# Altium footprint library misc.PcbLib: 60 footprints (part 2 of 4)
Each footprint in its own frame and in the unit in brackets; x right, y up, seen from the top. Pads: shape width x height; smd on the part's side, far side on the other; paste and mask are expansions set on the pad; w line width, h text height; cw(c..) or ccw(c..) is an arc to the next point about the centre after c.
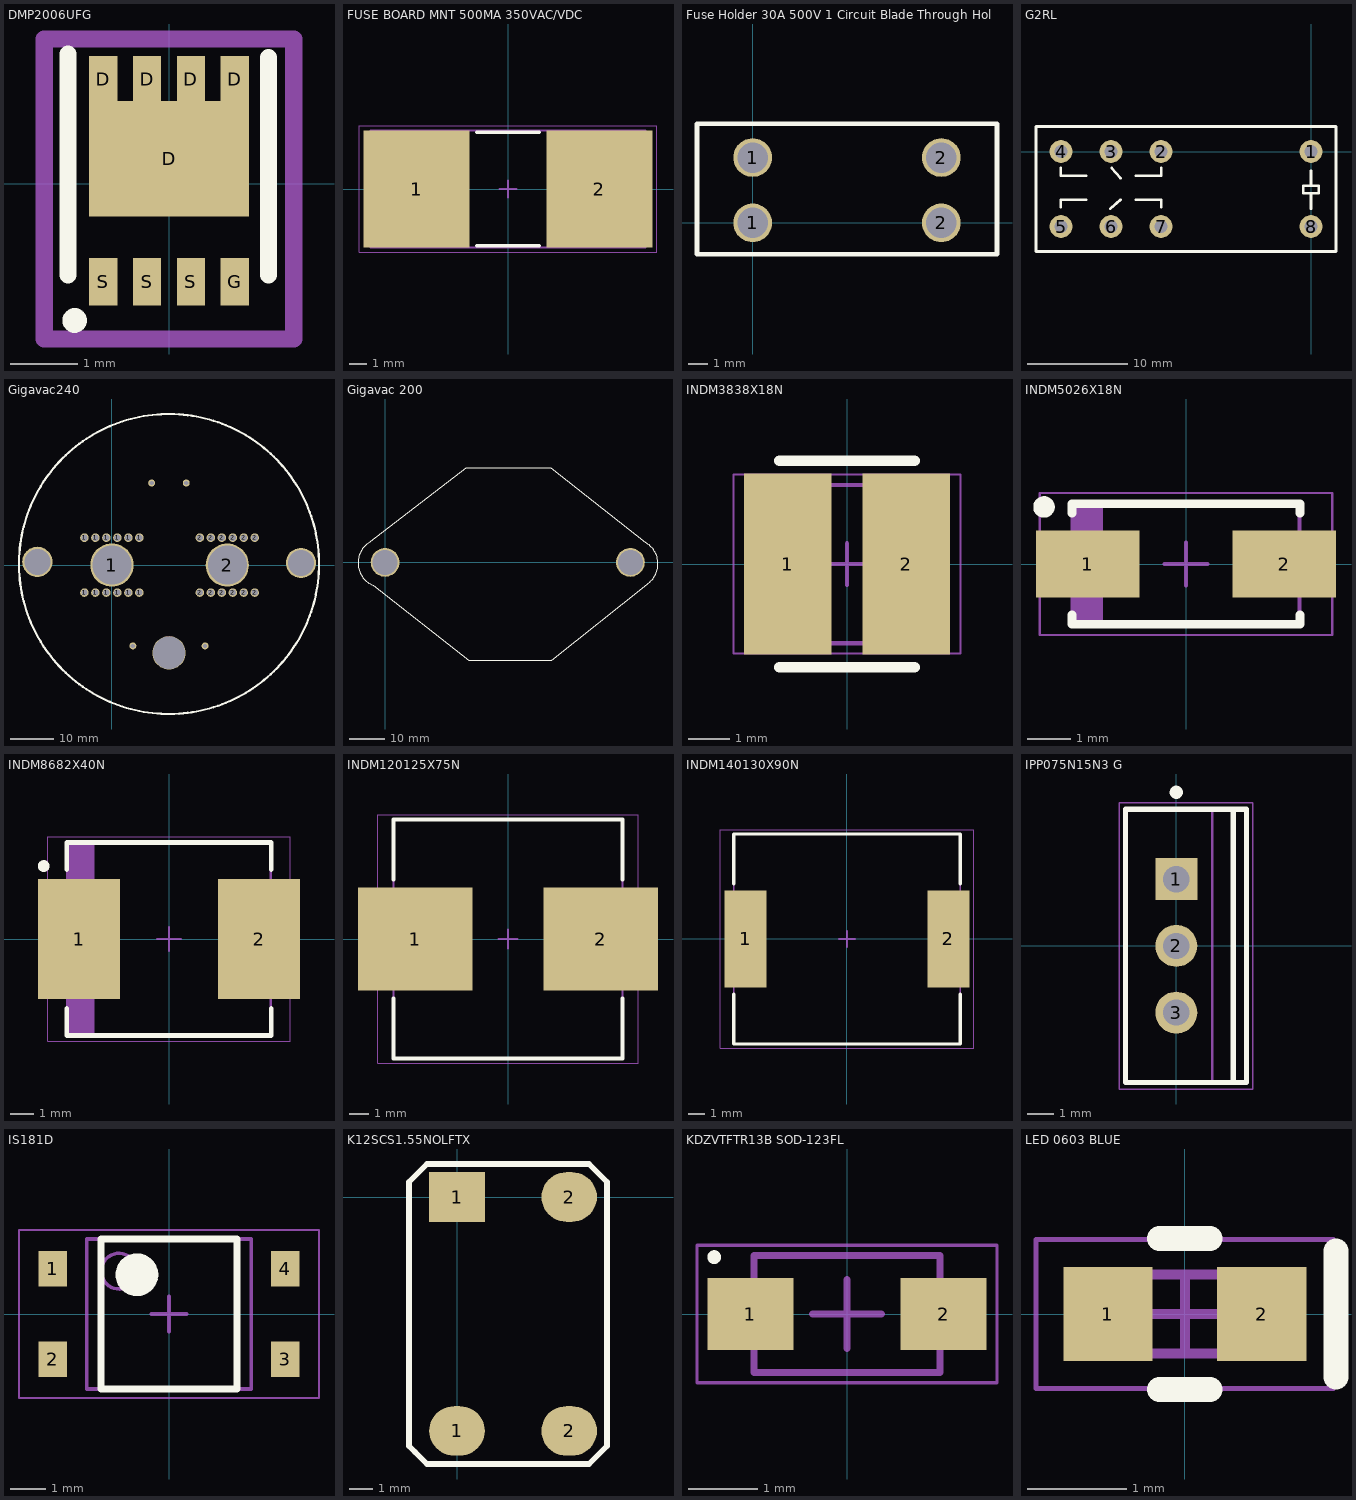
[diagram p1: the footprints below, top view; thin cyan lines are the x and y axes]

## DMP2006UFG [mm]
pads (9):
  rect 0.42x0.7 smd: D(-0.975,1.55) D(-0.325,1.55) D(0.325,1.55) D(0.975,1.55) G(0.975,-1.45) S(-0.975,-1.45) S(-0.325,-1.45) S(0.325,-1.45)
  rect 2.37x1.71 smd: D(0,0.375)
Top Overlay:
  circle w0.254: c-1.4,-2.025 r0.056
  lines w0.254: -1.5,-1.35 -1.5,1.925 ; 1.475,-1.35 1.475,1.875
Top Courtyard:
  lines w0.254: -1.85,-2.3 1.85,-2.3 1.85,2.15 -1.85,2.15 -1.85,-2.3
3D body: height 0.25, standoff 0, extent -1.65,-1.65 1.65,1.65

## FUSE BOARD MNT 500MA 350VAC/VDC [mm]
height 4.25
pads (2):
  rect 6.1x6.75 smd: 1(-5.25,0) 2(5.25,0)
Top Overlay:
  lines w0.2: -1.8,-3.275 1.8,-3.275 ; -1.8,3.275 1.8,3.275
Mechanical 13:
  lines w0.1: -7.925,-3.365 -7.925,3.365 7.925,3.365 7.925,-3.365 -7.925,-3.365
Mechanical 15:
  lines w0.05: -8.55,-3.65 -8.55,3.65 8.55,3.65 8.55,-3.65 -8.55,-3.65
  lines w0.1: -0.5,0 0.5,0 ; 0,-0.5 0,0.5
3D body: height 4.25, standoff 0, extent -2.295,-3.365 2.295,3.365
3D body: height 4.25, standoff 0, extent -7.925,-3.365 -2.295,3.365
3D body: height 4.25, standoff 0, extent 2.295,-3.365 7.925,3.365

## Fuse Holder 30A 500V 1 Circuit Blade Through Hole [mil]
pads (4):
  round 80 hole 63: 1(0,0) 1(0,135) 2(390,0) 2(390,135)
Top Overlay:
  lines w10: -115,-65 -115,37.5 -115,102.5 -115,205 505,205 505,147.5 505,61.25 505,2.5 505,-65 200,-65 -115,-65
3D body: height 290, standoff 20, extent -110,-60 505,200

## G2RL [mm]
height 15.5
pads (8):
  round 2.3 hole 1.3: 1(0,0) 2(-15,0) 3(-20,0) 4(-25,0) 5(-25,-7.5) 6(-20,-7.5) 7(-15,-7.5) 8(0,-7.5)
Top Overlay:
  lines w0.254: -25.019,-5.588 -25.019,-4.826 -22.479,-4.826 ; -25.019,-1.651 -25.019,-2.413 -22.479,-2.413 ; -20.066,-5.715 -19.05,-4.826 ; -19.939,-1.651 -19.05,-2.667 ; -17.526,-4.826 -14.986,-4.826 -14.986,-5.588 ; -17.526,-2.413 -14.986,-2.413 -14.986,-1.651 ; 0,-5.715 0,-4.191 ; 0,-1.905 0,-3.429 ; 0,-4.191 0.762,-4.191 0.762,-3.429 0,-3.429 ; 0,-4.191 -0.762,-4.191 -0.762,-3.429 0,-3.429 ; -27.5,-10 -27.5,2.5 2.5,2.5 2.5,-10 -27.5,-10
3D body: height 15.7, standoff 0, extent -27.432,-9.906 2.413,2.413

## Gigavac240 [mm]
pads (33):
  round 1.975 / inner round 1.6 / far side round 1.975 hole 1.475: 1(-6.35,-6.35) 1(-6.35,6.35) 1(-3.81,-6.35) 1(-3.81,6.35) 1(-1.27,-6.35) 1(-1.27,6.35) 1(1.27,-6.35) 1(1.27,6.35) 1(3.81,-6.35) 1(3.81,6.35) 1(6.35,-6.35) 1(6.35,6.35) 2(20.35,-6.35) 2(20.35,6.35) 2(22.89,-6.35) 2(22.89,6.35) 2(25.43,-6.35) 2(25.43,6.35) 2(27.97,-6.35) 2(27.97,6.35) 2(30.51,-6.35) 2(30.51,6.35) 2(33.05,-6.35) 2(33.05,6.35)
  round 10 hole 9: 1(0,0) 2(26.7,0)
  round 1.6 hole 1: 3(4.85,-18.7) 4(21.55,-18.7) 5(9.2,19) 6(17.2,19)
  round 7 hole 6: ""(-17.25,0.762) ""(43.75,0.508)
  round 7.7 hole 7.5: ""(13.208,-20.3)
Top Overlay:
  circle w0.5: c13.208,0.254 r34.708
3D body "7462095 (rev1).stp": height 3.1, standoff -3.5, extent 18.75,-8 34.75,8
3D body "GV144_non aux_step_041217.STEP": height 59.41, standoff -5.56, extent -16.764,-29.718 43.18,30.226
3D body "7462095 (rev1).stp": height 3.1, standoff -3.5, extent -8,-8 8,8

## Gigavac 200 [mm]
pads (2):
  round 8 hole 7: ""(0,0) ""(68.3,0)
Top Overlay:
  lines w0.254: 72.396,5.6 cw(c69.215,-0.381) 72.966,-6.022 46.355,-27.305 23.241,-27.305 -3.322,-6.399 cw(c-0.762,-0.127) -3.942,5.854 22.606,26.416 46.128,26.416 72.399,5.603
3D body "GV200_step_121715.STEP": height 184.32, standoff 0.11, extent -6.016,-28.003 89.328,28.004

## INDM3838X18N [mm] "Molded Inductor, 2-Leads, Body 3.80x3.80mm, IPC Medium Density"
height 1.8
pads (2):
  rect 2.1x4.35 smd: 1(-1.425,0) 2(1.425,0)
Top Overlay:
  lines w0.254: -1.619,-2.476 1.619,-2.476 ; -1.619,2.476 1.619,2.476
Mechanical 13:
  lines w0.1: -1.9,-1.9 1.9,-1.9 1.9,1.9 -1.9,1.9 -1.9,-1.9
Mechanical 15:
  lines w0.05: -2.725,-2.15 2.725,-2.15 2.725,2.15 -2.725,2.15 -2.725,-2.15
  lines w0.1: -0.5,0 0.5,0 ; 0,-0.5 0,0.5
3D body "INDM3838X18N.step": height 1.8, standoff 0, extent -2.12,-2.125 2.12,2.125

## INDM5026X18N [mm] "Molded Inductor, 2-Leads, Body 5.04x2.59mm, IPC Medium Density"
height 1.8
pads (2):
  rect 2.4x1.55 smd: 1(-2.286,0) 2(2.286,0)
Top Overlay:
  circle w0.25: c-3.3,1.325 r0.125
  lines w0.2: -2.65,-1.175 -2.65,-1.4 2.65,-1.4 2.65,-1.175 ; -2.65,1.175 -2.65,1.4 2.65,1.4 2.65,1.175
Mechanical 13:
  rectangle: -2.64,-1.395 -1.93,1.395
  lines w0.1: -2.64,-1.395 2.64,-1.395 2.64,1.395 -2.64,1.395 -2.64,-1.395
Mechanical 15:
  lines w0.05: -3.4,-1.65 3.4,-1.65 3.4,1.65 -3.4,1.65 -3.4,-1.65
  lines w0.1: -0.5,0 0.5,0 ; 0,-0.5 0,0.5
3D body "INDM5026X18N.step": height 1.8, standoff 0, extent -2.86,-1.395 2.86,1.395

## INDM8682X40N [mm] "Molded Inductor, 2-Leads, Body 8.64x8.18mm, IPC Medium Density"
height 4
pads (2):
  rect 3.5x5.1 smd: 1(-3.825,0) 2(3.825,0)
Top Overlay:
  circle w0.25: c-5.325,3.1 r0.125
  lines w0.2: -4.35,-2.95 -4.35,-4.1 4.35,-4.1 4.35,-2.95 ; -4.35,2.95 -4.35,4.1 4.35,4.1 4.35,2.95
Mechanical 13:
  rectangle: -4.32,-4.09 -3.158,4.09
  lines w0.1: -4.32,-4.09 -4.32,4.09 4.32,4.09 4.32,-4.09 -4.32,-4.09
Mechanical 15:
  lines w0.05: -5.15,-4.35 -5.15,4.35 5.15,4.35 5.15,-4.35 -5.15,-4.35
  lines w0.1: -0.5,0 0.5,0 ; 0,-0.5 0,0.5
3D body "INDM8682X40N.step": height 4, standoff 0, extent -4.54,-4.09 4.54,4.09

## INDM120125X75N [mm] "Molded Inductor, 2-Leads, Body 12.00x12.50mm, IPC Medium Density"
height 7.5
pads (2):
  rect 6x5.4 smd: 1(-4.85,0) 2(4.85,0)
Top Overlay:
  lines w0.2: -6,-3.1 -6,-6.25 6,-6.25 6,-3.1 ; -6,3.1 -6,6.25 6,6.25 6,3.1
Mechanical 13:
  lines w0.1: -6,-6.25 -6,6.25 6,6.25 6,-6.25 -6,-6.25
Mechanical 15:
  lines w0.05: -6.825,-6.5 -6.825,6.5 6.825,6.5 6.825,-6.5 -6.825,-6.5
  lines w0.1: -0.5,0 0.5,0 ; 0,-0.5 0,0.5
3D body "INDM120125X75N.step": height 7.5, standoff 0, extent -6.22,-6.25 6.22,6.25

## INDM140130X90N [mm] "Molded Inductor, 2-Leads, Body 14.00x13.00mm, IPC Medium Density"
height 9
pads (2):
  rect 2.6x6 smd: 1(-6.275,0) 2(6.275,0)
Top Overlay:
  lines w0.2: -7,-3.4 -7,-6.5 7,-6.5 7,-3.4 ; -7,3.4 -7,6.5 7,6.5 7,3.4
Mechanical 13:
  lines w0.1: -7,-6.5 -7,6.5 7,6.5 7,-6.5 -7,-6.5
Mechanical 15:
  lines w0.05: -7.825,-6.75 -7.825,6.75 7.825,6.75 7.825,-6.75 -7.825,-6.75
  lines w0.1: -0.5,0 0.5,0 ; 0,-0.5 0,0.5
3D body "INDM140130X90N.step": height 9, standoff 0, extent -7.22,-6.5 7.22,6.5

## IPP075N15N3 G [mm] "FM, 3-Leads, Body 10.03x8.98mm, Pitch 2.54mm"
height 20.75
pads (3):
  rect 1.6x1.6 hole 1: 1(0,2.54)
  round 1.6 hole 1: 2(0,0) 3(0,-2.54)
Top Overlay:
  circle w0.25: c0,5.85 r0.125
  lines w0.2: 2.17,-5.2 2.17,5.2 ; -1.93,-5.2 -1.93,5.2 2.67,5.2 2.67,-5.2 -1.93,-5.2
Mechanical 13:
  lines w0.1: 1.37,-5.2 1.37,5.2 ; -1.93,-5.2 2.67,-5.2 2.67,5.2 -1.93,5.2 -1.93,-5.2
Mechanical 15:
  lines w0.05: -2.18,-5.45 2.92,-5.45 2.92,5.45 -2.18,5.45 -2.18,-5.45
  lines w0.1: -0.5,0 0.5,0 ; 0,-0.5 0,0.5
3D body: height 20.75, standoff 19.83, extent 1.37,-5.025 2.67,5.025
3D body: height 18.32, standoff 17.95, extent 1.37,-5.025 2.67,-1.875
3D body: height 18.32, standoff 17.95, extent 1.37,1.875 2.67,5.025
3D body: height 17.95, standoff 17.58, extent 1.37,-5.025 2.67,-1.875
3D body: height 17.95, standoff 17.58, extent 1.37,1.875 2.67,5.025
3D body: height 18.67, standoff 18.32, extent 1.37,-5.025 2.67,-1.839
3D body: height 18.67, standoff 18.32, extent 1.37,1.839 2.67,5.025
3D body: height 17.59, standoff 17.23, extent 1.37,-5.025 2.67,-1.839
3D body: height 17.59, standoff 17.23, extent 1.37,1.839 2.67,5.025
3D body: height 19, standoff 18.67, extent 1.37,-5.025 2.67,-1.732
3D body: height 19, standoff 18.67, extent 1.37,1.732 2.67,5.025
3D body: height 17.24, standoff 16.91, extent 1.37,-5.025 2.67,-1.732
3D body: height 17.24, standoff 16.91, extent 1.37,1.732 2.67,5.025
3D body: height 19.28, standoff 18.99, extent 1.37,-5.025 2.67,-1.559
3D body: height 19.28, standoff 18.99, extent 1.37,1.559 2.67,5.025
3D body: height 16.91, standoff 16.62, extent 1.37,-5.025 2.67,-1.559
3D body: height 16.91, standoff 16.62, extent 1.37,1.559 2.67,5.025
3D body: height 19.51, standoff 19.28, extent 1.37,-5.025 2.67,-1.326
3D body: height 19.51, standoff 19.28, extent 1.37,1.326 2.67,5.025
3D body: height 16.63, standoff 16.39, extent 1.37,-5.025 2.67,-1.326
3D body: height 16.63, standoff 16.39, extent 1.37,1.326 2.67,5.025
3D body: height 19.69, standoff 19.51, extent 1.37,-5.025 2.67,-1.042
3D body: height 19.69, standoff 19.51, extent 1.37,1.042 2.67,5.025
3D body: height 16.4, standoff 16.22, extent 1.37,-5.025 2.67,-1.042
3D body: height 16.4, standoff 16.22, extent 1.37,1.042 2.67,5.025
3D body: height 19.79, standoff 19.68, extent 1.37,-5.025 2.67,-0.718
3D body: height 19.79, standoff 19.68, extent 1.37,0.718 2.67,5.025
3D body: height 16.22, standoff 16.11, extent 1.37,-5.025 2.67,-0.718
3D body: height 16.22, standoff 16.11, extent 1.37,0.718 2.67,5.025
3D body: height 19.83, standoff 19.79, extent 1.37,-5.025 2.67,-0.366
3D body: height 19.83, standoff 19.79, extent 1.37,0.366 2.67,5.025
3D body: height 16.12, standoff 16.08, extent 1.37,-5.025 2.67,-0.366
3D body: height 16.12, standoff 16.08, extent 1.37,0.366 2.67,5.025
3D body: height 16.08, standoff 14.35, extent 1.37,-5.025 2.67,5.025
3D body: height 14.35, standoff 4.8, extent -1.93,-5.2 2.67,5.2
3D body: height 0, standoff -1.6, extent -0.235,-2.92 0.235,-2.16
3D body: height 4.8, standoff 0, extent -0.235,-3.13 0.235,-1.95
3D body: height 0, standoff -1.6, extent -0.235,-0.38 0.235,0.38
3D body: height 4.8, standoff 0, extent -0.235,-0.59 0.235,0.59
3D body: height 0, standoff -1.6, extent -0.235,2.16 0.235,2.92
3D body: height 4.8, standoff 0, extent -0.235,1.95 0.235,3.13

## IS181D [mm]
height 2
pads (4):
  rect 0.8x1 smd: 1(-3.25,1.27) 2(-3.25,-1.27) 3(3.25,-1.27) 4(3.25,1.27)
Top Overlay:
  circle w0.6: c-0.9,1.1 r0.3
  lines w0.2: -1.9,-2.1 1.9,-2.1 1.9,2.1 -1.9,2.1 -1.9,-2.1
Top Assembly:
  circle w0.1: c-1.4,1.2 r0.5
  lines w0.1: -2.3,-2.1 2.3,-2.1 2.3,2.1 -2.3,2.1 -2.3,-2.1
Top Courtyard:
  lines w0.05: -4.2,-2.35 4.2,-2.35 4.2,2.35 -4.2,2.35 -4.2,-2.35
  lines w0.1: -0.5,0 0.5,0 ; 0,-0.5 0,0.5
3D body: height 2, standoff 0.1, extent -2.3,-2.1 2.3,2.1

## K12SCS1.55NOLFTX [mm]
pads (4):
  oval 2.35x2.1 smd: 1(0,-9.9) 2(4.75,-9.9) 2(4.75,0)
  rect 2.35x2.1 smd: 1(0,0)
Top Overlay:
  lines w0.254: -2.032,-10.541 -2.032,0.635 -1.27,1.397 5.588,1.397 6.35,0.635 6.35,-10.541 5.588,-11.303 -1.27,-11.303 -1.778,-10.795 -2.032,-10.541
3D body "K12SCS1.55NOLFTX.stp": height 9.08, standoff 0, extent -3.114,-10.753 7.686,0.847

## KDZVTFTR13B SOD-123FL [mm] "SODFL, 2-Leads, Body 1.60x3.50mm, IPC Medium Density"
height 0.9
pads (2):
  rect 1.25x1.05 smd: 1(-1.4,0) 2(1.4,0)
Top Overlay:
  circle w0.1: c-1.925,0.825 r0.05
Top Assembly:
  lines w0.1: -1.35,-0.85 -1.35,0.85 1.35,0.85 1.35,-0.85 -1.35,-0.85
Top Courtyard:
  lines w0.05: -2.175,-1 -2.175,1 2.175,1 2.175,-1 -2.175,-1
  lines w0.1: -0.5,0 0.5,0 ; 0,-0.5 0,0.5
3D body: height 0.9, standoff 0, extent -1.35,-0.85 1.35,0.85

## LED 0603 BLUE [mm] "Chip Diode, 2-Leads, Body 1.60x0.80mm"
height 0.75
pads (2):
  rect 0.9x0.95 smd: 1(-0.775,0) 2(0.775,0)
Top Overlay:
  lines w0.254: -0.254,-0.762 0.254,-0.762 ; -0.254,0.762 0.254,0.762 ; 1.524,-0.635 1.524,0.635
Mechanical 13:
  lines w0.1: -0.8,-0.4 -0.8,0.4 0.8,0.4 0.8,-0.4 -0.8,-0.4
Mechanical 15:
  lines w0.05: -1.5,-0.75 -1.5,0.75 1.5,0.75 1.5,-0.75 -1.5,-0.75
  lines w0.1: -0.4,0 0.4,0 ; 0,-0.4 0,0.4
3D body: height 0.8, standoff 0, extent -0.4,-0.4 0.4,0.4
3D body: height 0.8, standoff 0, extent -0.8,-0.4 -0.4,0.4
3D body: height 0.8, standoff 0, extent 0.4,-0.4 0.8,0.4